# Altium footprint library PcbLibUltimate (1).pcblib: 202 footprints (part 9 of 13)
Each footprint in its own frame and in the unit in brackets; x right, y up, seen from the top. Pads: shape width x height; smd on the part's side, far side on the other; paste and mask are expansions set on the pad; w line width, h text height; cw(c..) or ccw(c..) is an arc to the next point about the centre after c.
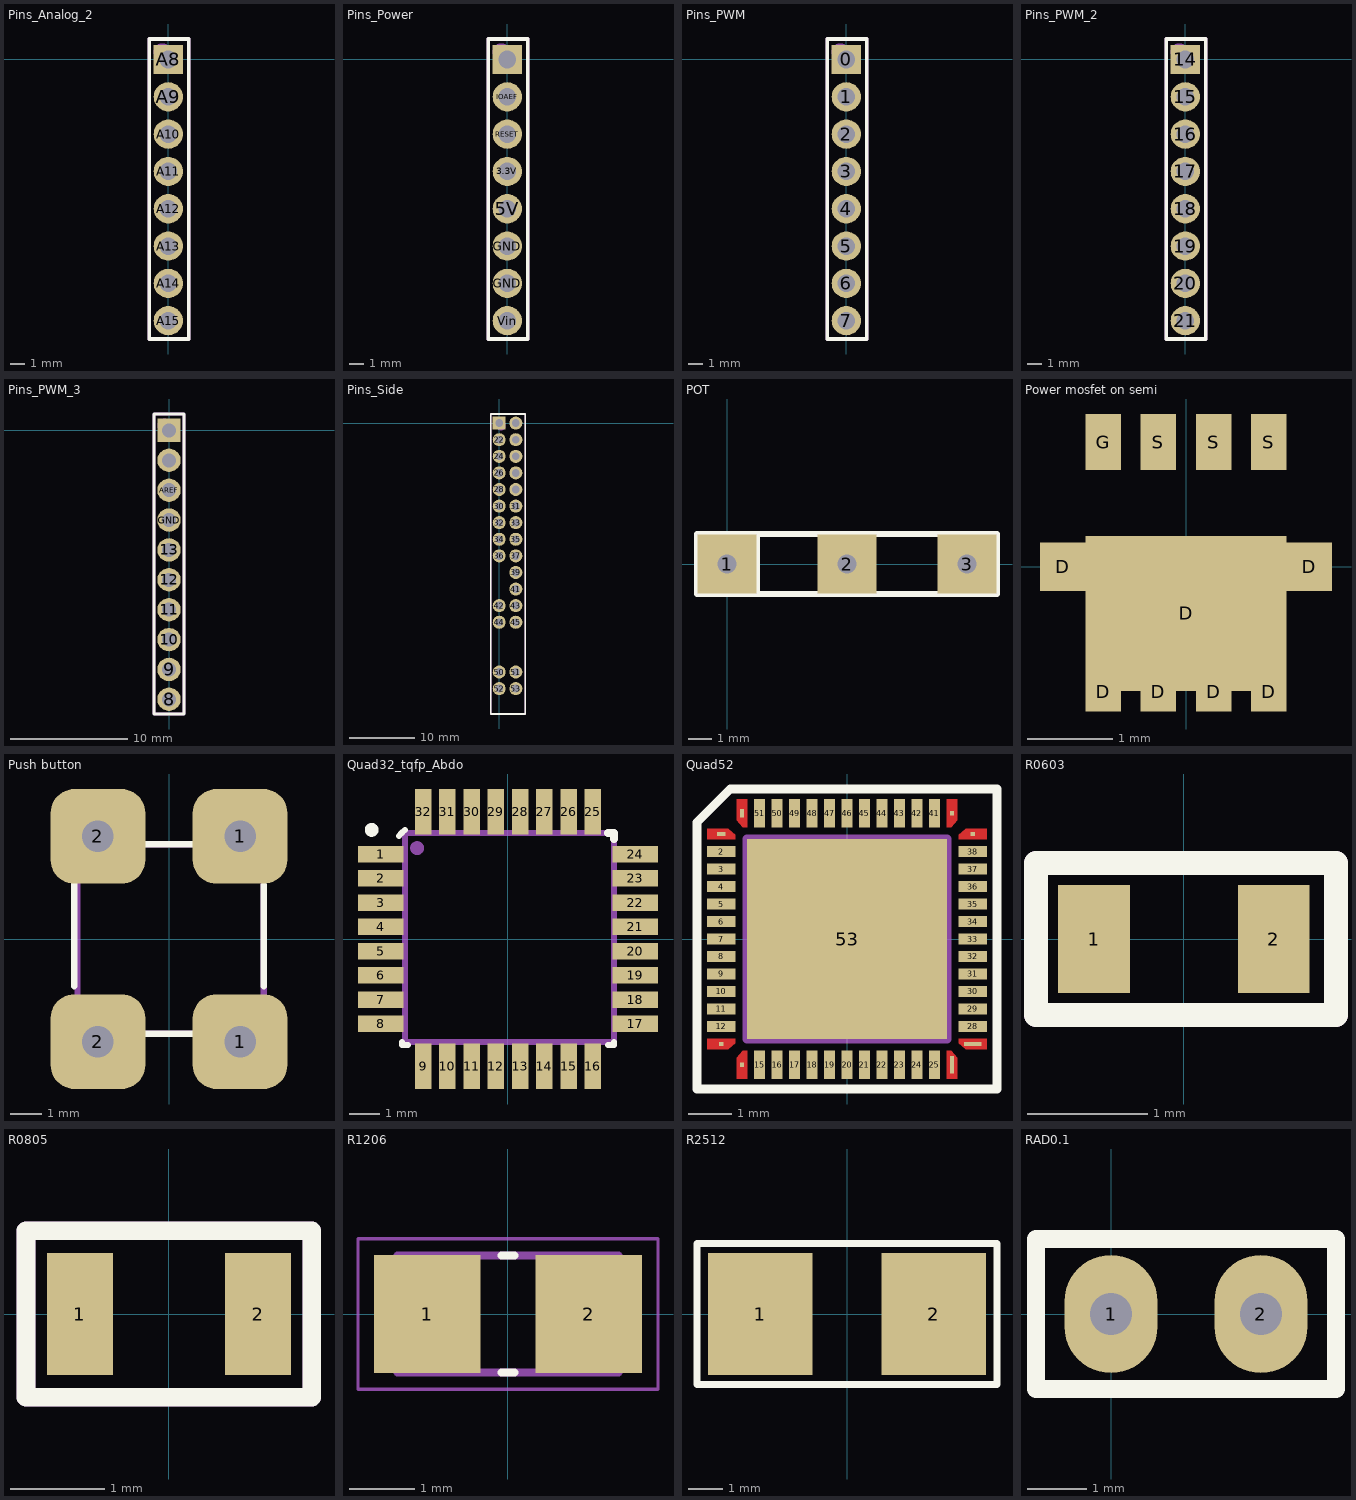
[diagram p8: the footprints below, top view; thin cyan lines are the x and y axes]

## Pins_Analog_2 [mm]
pads (8):
  rect 2x2 hole 1.2: A8(0,0)
  round 2 hole 1.2: A9(0,-2.55) A10(0,-5.1) A11(0,-7.65) A12(0,-10.2) A13(0,-12.75) A14(0,-15.3) A15(0,-17.85)
Top Overlay:
  lines w0.254: -1.3,-19.1 1.4,-19.1 1.4,1.4 -1.3,1.4 -1.3,0 -1.3,-19.1
Mechanical 2:
  circle w0.8: c-0.4,0.5 r0.2
  lines w0.254: -1.3,-19.1 -1.3,1.4 1.4,1.4 1.4,-19.1 -1.3,-19.1
  text ".Designator" at -0.5,-4.8 h1.52
3D body "61300811121 (rev1).stp": height 8.05, standoff -3.49, extent -1.24,-19.02 1.3,1.3

## Pins_Power [mm]
pads (8):
  round 2 hole 1.2: 3.3V(0,-7.65) 5V(0,-10.2) GND(0,-15.3) GND(0,-12.75) IOAEF(0,-2.55) RESET(0,-5.1) Vin(0,-17.85)
  rect 2x2 hole 1.2: ""(0,0)
Top Overlay:
  lines w0.254: -1.3,-19.1 -1.3,0 -1.3,1.4 1.4,1.4 1.4,-19.1 -1.3,-19.1
Mechanical 2:
  circle w0.8: c-0.4,0.5 r0.2
  lines w0.254: -1.3,-19.1 1.4,-19.1 1.4,1.4 -1.3,1.4 -1.3,-19.1
  text ".Designator" at -0.5,-4.8 h1.52
3D body "61300811121 (rev1).stp": height 8.05, standoff -3.49, extent -1.24,-19.02 1.3,1.3

## Pins_PWM [mm]
pads (8):
  rect 2x2 hole 1.2: 0(0,0)
  round 2 hole 1.2: 1(0,-2.55) 2(0,-5.1) 3(0,-7.65) 4(0,-10.2) 5(0,-12.75) 6(0,-15.3) 7(0,-17.85)
Top Overlay:
  lines w0.254: -1.3,-19.1 1.4,-19.1 1.4,1.4 -1.3,1.4 -1.3,0 -1.3,-19.1
Mechanical 2:
  circle w0.8: c-0.4,0.5 r0.2
  lines w0.254: -1.3,-19.1 -1.3,1.4 1.4,1.4 1.4,-19.1 -1.3,-19.1
  text ".Designator" at -0.5,-4.8 h1.52
3D body "61300811121 (rev1).stp": height 8.05, standoff -3.49, extent -1.24,-19.02 1.3,1.3

## Pins_PWM_2 [mm]
pads (8):
  rect 2x2 hole 1.2: 14(0,0)
  round 2 hole 1.2: 15(0,-2.55) 16(0,-5.1) 17(0,-7.65) 18(0,-10.2) 19(0,-12.75) 20(0,-15.3) 21(0,-17.85)
Top Overlay:
  lines w0.254: -1.3,-19.1 -1.3,0 -1.3,1.4 1.4,1.4 1.4,-19.1 -1.3,-19.1
Mechanical 2:
  circle w0.8: c-0.4,0.5 r0.2
  lines w0.254: -1.3,-19.1 1.4,-19.1 1.4,1.4 -1.3,1.4 -1.3,-19.1
  text ".Designator" at -0.5,-4.8 h1.52
3D body "61300811121 (rev1).stp": height 8.05, standoff -3.49, extent -1.24,-19.02 1.3,1.3

## Pins_PWM_3 [mm]
pads (10):
  round 2 hole 1.2: 8(0,-22.95) 9(0,-20.4) 10(0,-17.85) 11(0,-15.3) 12(0,-12.75) 13(0,-10.2) AREF(0,-5.1) GND(0,-7.65) ""(0,-2.55)
  rect 2x2 hole 1.2: ""(0,0)
Top Overlay:
  lines w0.254: -1.3,-24.2 1.3,-24.2 1.3,1.4 -1.3,1.4 -1.3,0.1 -1.3,-24.2
Mechanical 2:
  circle w0.8: c-0.4,0.4 r0.2
  lines w0.254: -1.3,-24.2 1.3,-24.2 1.3,1.4 -1.3,1.4 -1.3,-24.2
  text ".Designator" at -0.5,-5.7 h1.52
3D body "Download_STP_61301011121 (rev1).stp": height 8.55, standoff -2.99, extent -1.27,-24.1 1.27,1.3

## Pins_Side [mm]
pads (28):
  round 2 hole 1.2: 22(0,-2.55) 24(0,-5.1) 26(0,-7.65) 28(0,-10.2) 30(0,-12.75) 31(2.55,-12.75) 32(0,-15.3) 33(2.55,-15.3) 34(0,-17.85) 35(2.55,-17.85) 36(0,-20.4) 37(2.55,-20.4) 39(2.55,-22.95) 41(2.55,-25.5) 42(0,-28.05) 43(2.55,-28.05) 44(0,-30.6) 45(2.55,-30.6) 50(0,-38.25) 51(2.55,-38.25) 52(0,-40.8) 53(2.55,-40.8) ""(2.55,-10.2) ""(2.55,-7.65) ""(2.55,-5.1) ""(2.55,-2.55) ""(2.55,0)
  rect 2x2 hole 1.2: ""(0,0)
Top Overlay:
  lines w0.254: -1.3,-44.7 4,-44.7 4,1.4 -1.3,1.4 -1.3,-44.7
Mechanical 2:
  circle w1: c0.3,-0.4 r0.2
  lines w0.254: -1.3,-44.7 -1.3,1.4 4,1.4 4,-44.7 -1.3,-44.7
  text ".Designator" at 0.3,-8.6 h2.5
3D body "61301811121 (rev1).stp": height 8.55, standoff -2.99, extent -1.2,-44.52 1.34,1.2
3D body "61301811121 (rev1).stp": height 8.55, standoff -2.99, extent 1.37,-44.52 3.91,1.2

## POT [mm]
pads (3):
  rect 2.5x2.5 hole 0.813: 1(0,0) 2(5.08,0) 3(10.16,0)
Top Overlay:
  lines w0.254: 1.27,-1.27 1.27,1.27 ; -1.27,-1.27 -1.27,1.27 11.43,1.27 11.43,-1.27 -1.27,-1.27

## Power mosfet on semi [mm]
pads (11):
  rect 0.545x0.57 smd: D(-1.45,0) D(1.45,0)
  rect 0.42x0.47 smd: D(-0.975,-1.47) D(-0.325,-1.47) D(0.325,-1.47) D(0.975,-1.47)
  rect 2.37x1.83 smd: D(0,-0.55)
  rect 0.42x0.66 smd: G(-0.975,1.47) S(-0.325,1.47) S(0.325,1.47) S(0.975,1.47)
3D body "User Library-PowerPAK 1212-8-SiS892DN.step": height 1.04, standoff 0, extent -1.65,-1.65 1.65,1.65

## Push button [mm]
pads (4):
  rrect50% 3x3 hole 1: 1(2.25,-3.25) 1(2.25,3.25) 2(-2.25,-3.25) 2(-2.25,3.25)
Top Overlay:
  lines w0.2: -3,-1.5 -3,1.8 ; -0.9,-3 0.9,-3 ; -0.9,3 0.8,3 ; 3,-1.5 3,1.7
Mechanical 29:
  lines w0.2: -2.9,-3 -2.9,3 3,3 3,-3 -2.9,-3
  text "'.Designator'" at 0.7,-3.2 h1.52
3D body "User Library-FSM4JLH(1825910-5).step": height 5, standoff -3.51, extent -2.995,-3.898 2.995,3.9

## Quad32_tqfp_Abdo [mm]
pads (32):
  rect 1.5x0.55 smd mask+0.06: 1(-4.2,2.8) 2(-4.2,2) 3(-4.2,1.2) 4(-4.2,0.4) 5(-4.2,-0.4) 6(-4.2,-1.2) 7(-4.2,-2) 8(-4.2,-2.8) 17(4.2,-2.8) 18(4.2,-2) 19(4.2,-1.2) 20(4.2,-0.4) 21(4.2,0.4) 22(4.2,1.2) 23(4.2,2) 24(4.2,2.8)
  rect 0.55x1.5 smd mask+0.06: 9(-2.8,-4.2) 10(-2,-4.2) 11(-1.2,-4.2) 12(-0.4,-4.2) 13(0.4,-4.2) 14(1.2,-4.2) 15(2,-4.2) 16(2.8,-4.2) 25(2.8,4.2) 26(2,4.2) 27(1.2,4.2) 28(0.4,4.2) 29(-0.4,4.2) 30(-1.2,4.2) 31(-2,4.2) 32(-2.8,4.2)
Top Overlay:
  circle w0.254: c-4.5,3.6 r0.1
  lines w0.2: -3.6,3.4 -3.5,3.5 -3.4,3.6 ; -3.3,-3.5 -3.5,-3.5 ; 3.3,-3.5 3.5,-3.5 3.5,-3.4 ; -3.5,-3.5 -3.5,-3.4 -3.5,-3.5
  lines w0.254: 3.3,3.5 3.5,3.5 3.5,3.3
Mechanical 29:
  circle w0.254: c-3,3 r0.1
  lines w0.2: 3.4,-3.4 -3.4,-3.4 -3.4,3.5 3.5,3.5 3.5,-3.5
  text "String'.Designator'" at 0.4,-2.3 h1.52
3D body "User Library-tqfp32.step": height 1.2, standoff 0, extent -4.599,-4.599 4.599,4.6

## Quad52 [mm]
pads (54):
  rect 0.2x0.1 smd paste+0 mask+0.05: 1(-2.875,2.4)
  rect 0.65x0.25 smd mask+0.05: 2(-2.875,2) 3(-2.875,1.6) 4(-2.875,1.2) 5(-2.875,0.8) 6(-2.875,0.4) 7(-2.875,0) 8(-2.875,-0.4) 9(-2.875,-0.8) 10(-2.875,-1.2) 11(-2.875,-1.6) 12(-2.875,-2) 28(2.875,-2) 29(2.875,-1.6) 30(2.875,-1.2) 31(2.875,-0.8) 32(2.875,-0.4) 33(2.875,0) 34(2.875,0.4) 35(2.875,0.8) 36(2.875,1.2) 37(2.875,1.6) 38(2.875,2)
  rect 0.1x0.1 smd paste+0 mask+0.05: 13(-2.875,-2.4) 14(-2.4,-2.875) 39(2.875,2.4) 40(2.4,2.875)
  rect 0.25x0.65 smd mask+0.05: 15(-2,-2.875) 16(-1.6,-2.875) 17(-1.2,-2.875) 18(-0.8,-2.875) 19(-0.4,-2.875) 20(0,-2.875) 21(0.4,-2.875) 22(0.8,-2.875) 23(1.2,-2.875) 24(1.6,-2.875) 25(2,-2.875) 41(2,2.875) 42(1.6,2.875) 43(1.2,2.875) 44(0.8,2.875) 45(0.4,2.875) 46(0,2.875) 47(-0.4,2.875) 48(-0.8,2.875) 49(-1.2,2.875) 50(-1.6,2.875) 51(-2,2.875)
  round 0 smd mask+0.05: 17(-2.875,2.4)
  rect 0.1x0.4 smd paste+0 mask+0.05: 26(2.4,-2.875)
  rect 0.4x0.1 smd paste+0 mask+0.05: 27(2.875,-2.4)
  rect 0.1x0.2 smd paste+0 mask+0.05: 52(-2.4,2.875)
  rect 4.572x4.572 smd mask+0.05: 53(0,0)
Top Layer:
  region: -3.2,-2.275 -2.55,-2.275 -2.55,-2.385 -2.715,-2.525 -3.2,-2.525
  region: 2.275,-3.2 2.275,-2.55 2.385,-2.55 2.525,-2.715 2.525,-3.2
  region: 3.2,-2.275 2.55,-2.275 2.55,-2.385 2.715,-2.525 3.2,-2.525
  region: 3.2,2.275 2.55,2.275 2.55,2.385 2.715,2.525 3.2,2.525
  region: 2.275,3.2 2.275,2.55 2.385,2.55 2.525,2.715 2.525,3.2
  region: -2.275,3.2 -2.275,2.55 -2.385,2.55 -2.525,2.715 -2.525,3.2
  region: -3.2,2.275 -2.55,2.275 -2.55,2.385 -2.715,2.525 -3.2,2.525
  pour cut-out: 2.667,2.54
  pour cut-out: 2.667,2.54
  region: -2.275,-3.2 -2.275,-2.55 -2.385,-2.55 -2.525,-2.715 -2.525,-3.2
Top Overlay:
  lines w0.2: -3.429,-3.429 -3.429,2.671 -2.671,3.429 3.429,3.429 3.429,-3.429 -3.429,-3.429
Mechanical 29:
  lines w0.2: -2.286,-2.286 2.286,-2.286 2.286,2.286 -2.286,2.286 -2.286,-2.286
3D body "LC709511FQD-A00TWG.stp": height 1, standoff 0, extent -3.05,-3.05 3.05,3.05

## R0603 [mm]
pads (2):
  rect 0.6x0.9 smd: 1(-0.75,0) 2(0.75,0)
Top Overlay:
  lines w0.2: -1.235,-0.635 -1.235,0.635 1.27,0.635 1.27,-0.635 -1.235,-0.635
Mechanical 29:
  lines w0.2: -1.235,-0.635 -1.235,0.635 1.27,0.635 1.27,-0.635 -1.235,-0.635
3D body "R0603.step": height 0.8, standoff 0, extent -0.8,-0.4 0.8,0.44

## R0805 [mm]
pads (2):
  rect 0.7x1.3 smd: 1(-0.95,0) 2(0.95,0)
Top Overlay:
  lines w0.2: -1.524,-0.889 1.524,-0.889 1.524,0.889 -1.524,0.889 -1.524,-0.889
Mechanical 29:
  lines w0.2: -1.524,-0.889 -1.524,0.889 1.524,0.889 1.524,-0.889 -1.524,-0.889
3D body "User Library-Chip Resistor2 (2).step": height 0.7, standoff 0, extent -1,-0.6 1,0.6

## R1206 [mm]
pads (2):
  rect 1.64x1.82 smd: 1(-1.24,0) 2(1.24,0)
Top Overlay:
  lines w0.127: -0.1,-0.9 0.1,-0.9 ; -0.1,0.9 0.1,0.9
Mechanical 13:
  lines w0.127: -1.7,-0.9 1.7,-0.9 1.7,0.9 -1.7,0.9 -1.7,-0.9
Mechanical 15:
  lines w0.05: -2.308,-1.158 2.308,-1.158 2.308,1.158 -2.308,1.158 -2.308,-1.158
3D body "ERJ-8BWJR024V--3DModel-STEP-46669.STEP": height 0.75, standoff 0, extent -1.6,-0.8 1.6,0.8

## R2512 [mm]
pads (2):
  rect 3x3.5 smd: 1(-2.5,0) 2(2.5,0)
Top Overlay:
  lines w0.2: -4.318,-2.032 -4.318,-0.432 -4.318,2.032 4.318,2.032 4.318,-2.032 -4.318,-2.032
3D body "CircuitWorks-RESISTOR 2512.step": height 0.58, standoff -0.03, extent -3.175,-1.63 3.175,1.63

## RAD0.1 [mil]
pads (2):
  oval 62x78.74 hole 28: 1(0,0) 2(100,0)
Top Overlay:
  lines w12: -50,-50 -50,50 150,50 150,-50 -50,-50